# Altium footprint library Connector.PcbLib: 37 footprints (part 2 of 3)
Each footprint in its own frame and in the unit in brackets; x right, y up, seen from the top. Pads: shape width x height; smd on the part's side, far side on the other; paste and mask are expansions set on the pad; w line width, h text height; cw(c..) or ccw(c..) is an arc to the next point about the centre after c.
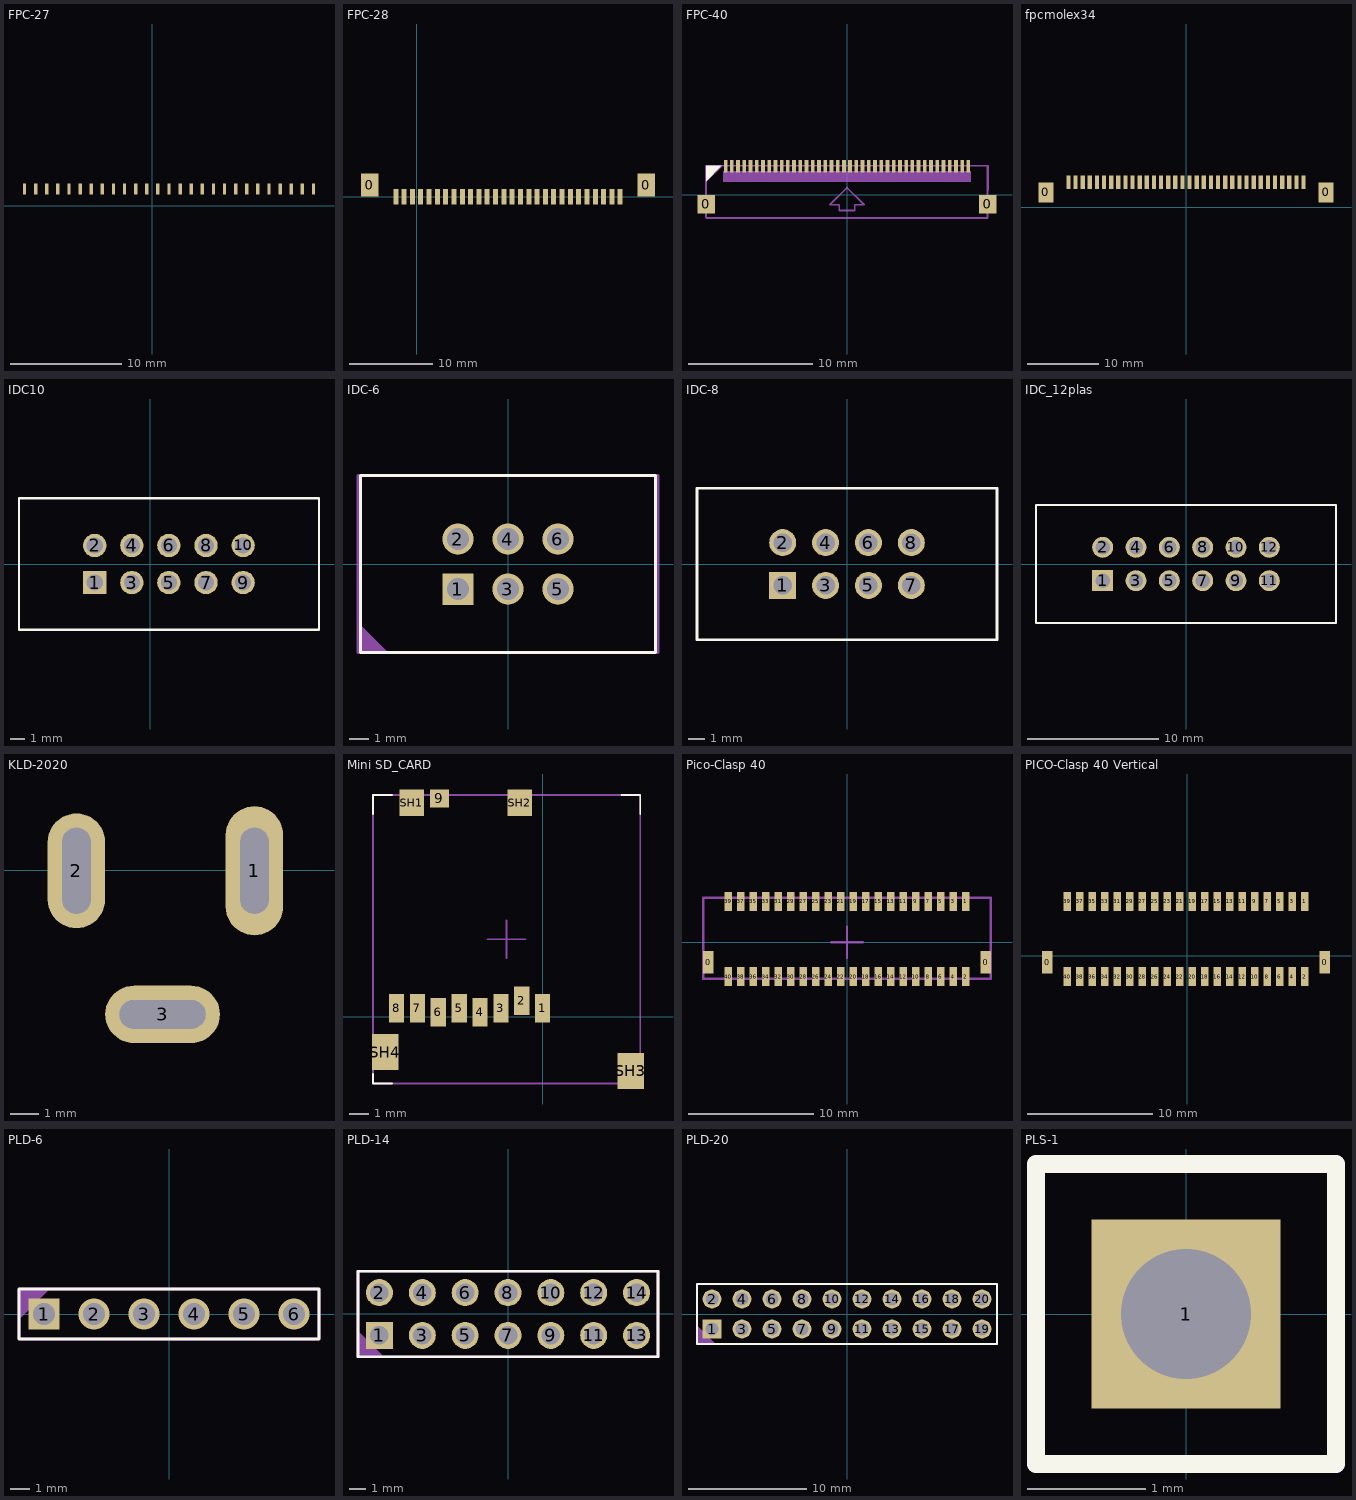
[diagram p1: the footprints below, top view; thin cyan lines are the x and y axes]

## FPC-27 [mm]
pads (27):
  rect 0.3x1 smd: 1(-11.5,1.5) 2(-10.5,1.5) 3(-9.5,1.5) 4(-8.5,1.5) 5(-7.5,1.5) 6(-6.5,1.5) 7(-5.5,1.5) 8(-4.5,1.5) 9(-3.5,1.5) 10(-2.5,1.5) 11(-1.5,1.5) 12(-0.5,1.5) 13(0.5,1.5) 14(1.5,1.5) 15(2.5,1.5) 16(3.5,1.5) 17(4.5,1.5) 18(5.5,1.5) 19(6.5,1.5) 20(7.5,1.5) 21(8.5,1.5) 22(9.5,1.5) 23(10.5,1.5) 24(11.5,1.5) 25(12.5,1.5) 26(13.5,1.5) 27(14.5,1.5)
3D body "522072760.stp": height 2.85, standoff 0.15, extent -15.15,-6.3 18.15,1.3

## FPC-28 [mm]
pads (30):
  rect 2.1x2.8 smd: 0(-5.65,1.4) 0(27.65,1.4)
  rect 0.6x1.9 smd: 1(-2.5,0) 2(-1.5,0) 3(-0.5,0) 4(0.5,0) 5(1.5,0) 6(2.5,0) 7(3.5,0) 8(4.5,0) 9(5.5,0) 10(6.5,0) 11(7.5,0) 12(8.5,0) 13(9.5,0) 14(10.5,0) 15(11.5,0) 16(12.5,0) 17(13.5,0) 18(14.5,0) 19(15.5,0) 20(16.5,0) 21(17.5,0) 22(18.5,0) 23(19.5,0) 24(20.5,0) 25(21.5,0) 26(22.5,0) 27(23.5,0) 28(24.5,0)
3D body "28.stp": height 3, standoff 0, extent -6.5,0 28.5,7.4

## FPC-40 [mm]
pads (42):
  rect 1.4x1.5 smd: 0(-11.3,-0.75) 0(11.3,-0.75)
  rect 0.3x1 smd: 1(-9.75,2.3) 2(-9.25,2.3) 3(-8.75,2.3) 4(-8.25,2.3) 5(-7.75,2.3) 6(-7.25,2.3) 7(-6.75,2.3) 8(-6.25,2.3) 9(-5.75,2.3) 10(-5.25,2.3) 11(-4.75,2.3) 12(-4.25,2.3) 13(-3.75,2.3) 14(-3.25,2.3) 15(-2.75,2.3) 16(-2.25,2.3) 17(-1.75,2.3) 18(-1.25,2.3) 19(-0.75,2.3) 20(-0.25,2.3) 21(0.25,2.3) 22(0.75,2.3) 23(1.25,2.3) 24(1.75,2.3) 25(2.25,2.3) 26(2.75,2.3) 27(3.25,2.3) 28(3.75,2.3) 29(4.25,2.3) 30(4.75,2.3) 31(5.25,2.3) 32(5.75,2.3) 33(6.25,2.3) 34(6.75,2.3) 35(7.25,2.3) 36(7.75,2.3) 37(8.25,2.3) 38(8.75,2.3) 39(9.25,2.3) 40(9.75,2.3)
Top Overlay:
  region: -11.325,1.1 -11.325,2.325 -10.1,2.325
Mechanical 29:
  region: 9.95,1.9 -9.975,1.9 -9.975,1.025 9.95,1.025
  region: -11.3,1.025 -11.275,1.05 -11.275,2.325 -10,2.325
  lines w0.15: -11.325,0.375 -11.325,2.325 ; -11.3,-1.875 -0.55,-1.875 11.3,-1.875 ; -10.2,2.325 -11.325,2.325 ; 10.2,2.325 11.325,2.325 11.325,0.375 ; -11.325,2.325 11.3,2.325 11.3,-1.85 -11.325,-1.85 -11.325,2.325 ; -1.375,-0.8 -0.625,-0.8 ; -1.375,-0.8 0,0.575 ; -1.375,-0.8 -0.625,-0.8 ; -1.375,-0.8 0,0.575 ; -0.625,-0.8 -0.625,-1.275 0.625,-1.275 0.625,-0.8 ; -0.625,-0.8 -0.625,-1.25 0.625,-1.25 0.625,-0.8 ; 0,0.575 1.375,-0.8 ; 0,0.575 1.375,-0.8 ; 0.625,-0.8 1.375,-0.8 ; 0.625,-0.8 1.375,-0.8
  text ".Designator" at -8.5,-0.675 h1
3D body "FPC-40.STEP": height 1.2, standoff -0.02, extent -11.025,-0.95 10.975,2.05

## fpcmolex34 [mm]
pads (36):
  rect 2.1x2.8 smd: 0(-19.65,2.1) 0(19.65,2.1)
  rect 0.6x1.9 smd: 1(-16.5,3.5) 2(-15.5,3.5) 3(-14.5,3.5) 4(-13.5,3.5) 5(-12.5,3.5) 6(-11.5,3.5) 7(-10.5,3.5) 8(-9.5,3.5) 9(-8.5,3.5) 10(-7.5,3.5) 11(-6.5,3.5) 12(-5.5,3.5) 13(-4.5,3.5) 14(-3.5,3.5) 15(-2.5,3.5) 16(-1.5,3.5) 17(-0.5,3.5) 18(0.5,3.5) 19(1.5,3.5) 20(2.5,3.5) 21(3.5,3.5) 22(4.5,3.5) 23(5.5,3.5) 24(6.5,3.5) 25(7.5,3.5) 26(8.5,3.5) 27(9.5,3.5) 28(10.5,3.5) 29(11.5,3.5) 30(12.5,3.5) 31(13.5,3.5) 32(14.5,3.5) 33(15.5,3.5) 34(16.5,3.5)
3D body "FPCright angle 34.stp": height 2.85, standoff 0.15, extent -20.15,-4.05 20.15,3.55

## IDC10 [mm]
pads (10):
  rect 1.6x1.6 hole 1.1: 1(-3.81,-1.27)
  round 1.6 hole 1.1: 2(-3.81,1.27) 3(-1.27,-1.27) 4(-1.27,1.27) 5(1.27,-1.27) 6(1.27,1.27) 7(3.81,-1.27) 8(3.81,1.27) 9(6.35,-1.27) 10(6.35,1.27)
Top Overlay:
  lines w0.15: -9,-4.5 11.55,-4.5 11.55,4.5 -9,4.5 -9,-4.5
3D body: height 9, standoff 0, extent -9,-4.5 11.55,4.5
3D body: height 3, standoff 0, extent -9,-4.5 11.55,4.5
3D body "PLS-1.STEP": height 8.5, standoff -3, extent 2.54,-2.54 5.08,0
3D body "PLS-1.STEP": height 8.5, standoff -3, extent 2.54,0 5.08,2.54
3D body "PLS-1.STEP": height 8.5, standoff -3, extent 0,-2.54 2.54,0
3D body "PLS-1.STEP": height 8.5, standoff -3, extent 0,0 2.54,2.54
3D body "PLS-1.STEP": height 8.5, standoff -3, extent -2.54,-2.54 0,0
3D body "PLS-1.STEP": height 8.5, standoff -3, extent -2.54,0 0,2.54
3D body "PLS-1.STEP": height 8.5, standoff -3, extent -5.08,0 -2.54,2.54
3D body "PLS-1.STEP": height 8.5, standoff -3, extent -5.08,-2.54 -2.54,0
3D body "PLS-1.STEP": height 8.5, standoff -3, extent 5.08,0 7.62,2.54
3D body "PLS-1.STEP": height 8.5, standoff -3, extent 5.08,-2.54 7.62,0

## IDC-6 [mm]
height 8
pads (6):
  rect 1.6x1.6 hole 1.1: 1(-2.54,-1.27)
  round 1.6 hole 1.1: 2(-2.54,1.27) 3(0,-1.27) 4(0,1.27) 5(2.54,-1.27) 6(2.54,1.27)
Top Overlay:
  lines w0.15: -7.5,-4.5 -7.5,4.5 7.5,4.5 7.5,-4.5 -7.5,-4.5
Mechanical 29:
  region: -7.62,-4.5 -7.62,-2.976 -6.096,-4.5
  lines w0.15: -7.62,-4.5 7.62,-4.5 7.62,4.5 -7.62,4.5 -7.62,-4.5
  text ".Designator" at -3.5,-0.3 h1
3D body "PLS-1.STEP": height 8.5, standoff -3, extent -3.81,-2.54 -1.27,0
3D body "PLS-1.STEP": height 8.5, standoff -3, extent -3.81,0 -1.27,2.54
3D body "PLS-1.STEP": height 8.5, standoff -3, extent -1.27,0 1.27,2.54
3D body "PLS-1.STEP": height 8.5, standoff -3, extent -1.27,-2.54 1.27,0
3D body "PLS-1.STEP": height 8.5, standoff -3, extent 1.27,0 3.81,2.54
3D body "PLS-1.STEP": height 8.5, standoff -3, extent 1.27,-2.54 3.81,0
3D body: height 9, standoff 0, extent -7.5,-4.5 7.5,4.5
3D body: height 3, standoff 0, extent -7.5,-4.5 7.5,4.5

## IDC-8 [mm]
pads (8):
  rect 1.6x1.6 hole 1.1: 1(-3.81,-1.27)
  round 1.6 hole 1.1: 2(-3.81,1.27) 3(-1.27,-1.27) 4(-1.27,1.27) 5(1.27,-1.27) 6(1.27,1.27) 7(3.81,-1.27) 8(3.81,1.27)
Top Overlay:
  lines w0.15: -8.89,-4.5 8.89,-4.5 8.89,4.5 -8.89,4.5 -8.89,-4.5
3D body: height 9, standoff 0, extent -9,-4.5 9,4.5
3D body: height 3, standoff 0, extent -9,-4.5 9,4.5
3D body "PLS-1.STEP": height 8.5, standoff -3, extent 2.54,-2.54 5.08,0
3D body "PLS-1.STEP": height 8.5, standoff -3, extent 2.54,0 5.08,2.54
3D body "PLS-1.STEP": height 8.5, standoff -3, extent 0,-2.54 2.54,0
3D body "PLS-1.STEP": height 8.5, standoff -3, extent 0,0 2.54,2.54
3D body "PLS-1.STEP": height 8.5, standoff -3, extent -2.54,-2.54 0,0
3D body "PLS-1.STEP": height 8.5, standoff -3, extent -2.54,0 0,2.54
3D body "PLS-1.STEP": height 8.5, standoff -3, extent -5.08,0 -2.54,2.54
3D body "PLS-1.STEP": height 8.5, standoff -3, extent -5.08,-2.54 -2.54,0

## IDC_12plas [mm]
pads (12):
  rect 1.6x1.6 hole 1.1: 1(-6.35,-1.27)
  round 1.6 hole 1.1: 2(-6.35,1.27) 3(-3.81,-1.27) 4(-3.81,1.27) 5(-1.27,-1.27) 6(-1.27,1.27) 7(1.27,-1.27) 8(1.27,1.27) 9(3.81,-1.27) 10(3.81,1.27) 11(6.35,-1.27) 12(6.35,1.27)
Top Overlay:
  lines w0.15: -11.43,-4.5 11.43,-4.5 11.43,4.5 -11.43,4.5 -11.43,-4.5
3D body "PLS-1.STEP": height 8.5, standoff -3, extent 5.08,-2.54 7.62,0
3D body "PLS-1.STEP": height 8.5, standoff -3, extent 5.08,0 7.62,2.54
3D body "PLS-1.STEP": height 8.5, standoff -3, extent 2.54,-2.54 5.08,0
3D body "PLS-1.STEP": height 8.5, standoff -3, extent 2.54,0 5.08,2.54
3D body "PLS-1.STEP": height 8.5, standoff -3, extent 0,-2.54 2.54,0
3D body "PLS-1.STEP": height 8.5, standoff -3, extent 0,0 2.54,2.54
3D body "PLS-1.STEP": height 8.5, standoff -3, extent -2.54,-2.54 0,0
3D body "PLS-1.STEP": height 8.5, standoff -3, extent -2.54,0 0,2.54
3D body "PLS-1.STEP": height 8.5, standoff -3, extent -5.08,-2.54 -2.54,0
3D body "PLS-1.STEP": height 8.5, standoff -3, extent -5.08,0 -2.54,2.54
3D body "PLS-1.STEP": height 8.5, standoff -3, extent -7.62,0 -5.08,2.54
3D body "PLS-1.STEP": height 8.5, standoff -3, extent -7.62,-2.54 -5.08,0
3D body: height 9, standoff 0, extent -11.5,-4.5 11.5,4.5
3D body: height 3, standoff 0, extent -11.5,-4.5 11.5,4.5

## KLD-2020 [mm]
pads (3):
  oval 2x4.5 hole 1 slot 3 at 90 deg: 1(13.475,-0.025)
  oval 2x4 hole 1 slot 3 at 90 deg: 2(7.275,-0.025)
  oval 4x2 hole 1 slot 3 at 0 deg: 3(10.275,-5.025)
3D body "User Library-KLD-0202-AC.step": height 12.1, standoff -2.6, extent -0.031,-4.95 14.6,4.45

## Mini SD_CARD [mm]
pads (13):
  rect 0.8x1.5 smd: 1(0,0.45) 2(-1.1,0.85) 3(-2.2,0.45) 4(-3.3,0.25) 5(-4.4,0.45) 6(-5.5,0.25) 7(-6.6,0.45) 8(-7.7,0.45)
  rect 1x0.95 smd: 9(-5.45,11.525)
  rect 1.3x1.4 smd: SH1(-6.9,11.3) SH2(-1.2,11.3)
  rect 1.4x1.9 smd: SH3(4.65,-2.85) SH4(-8.3,-1.85)
Top Overlay:
  lines w0.1: -8.95,-3 -8.95,-3.5 -7.95,-3.5 ; -8.95,10.7 -8.95,11.7 -7.95,11.7 ; 4.15,11.7 5.15,11.7 5.15,10.7
Mechanical 1:
  lines w0.1: -2.9,4.1 -0.9,4.1 ; -1.9,3.1 -1.9,5.1
Mechanical 32:
  lines w0.1: -8.95,-3.5 5.15,-3.5 5.15,11.7 -8.95,11.7 -8.95,-3.5
3D body "473521001.stp": height 1.95, standoff 0.07, extent -8.95,-3.5 5.15,11.7

## Pico-Clasp 40 [mm] "2035674007 Molex"
height 8.25
pads (42):
  rect 0.85x1.8 smd: 0(-11.1,-1.6) 0(11.1,-1.6)
  rect 0.6x1.5 smd: 1(9.5,3.25) 2(9.5,-2.75) 3(8.5,3.25) 4(8.5,-2.75) 5(7.5,3.25) 6(7.5,-2.75) 7(6.5,3.25) 8(6.5,-2.75) 9(5.5,3.25) 10(5.5,-2.75) 11(4.5,3.25) 12(4.5,-2.75) 13(3.5,3.25) 14(3.5,-2.75) 15(2.5,3.25) 16(2.5,-2.75) 17(1.5,3.25) 18(1.5,-2.75) 19(0.5,3.25) 20(0.5,-2.75) 21(-0.5,3.25) 22(-0.5,-2.75) 23(-1.5,3.25) 24(-1.5,-2.75) 25(-2.5,3.25) 26(-2.5,-2.75) 27(-3.5,3.25) 28(-3.5,-2.75) 29(-4.5,3.25) 30(-4.5,-2.75) 31(-5.5,3.25) 32(-5.5,-2.75) 33(-6.5,3.25) 34(-6.5,-2.75) 35(-7.5,3.25) 36(-7.5,-2.75) 37(-8.5,3.25) 38(-8.5,-2.75) 39(-9.5,3.25) 40(-9.5,-2.75)
Mechanical 32:
  lines w0.2: -1.25,0 0,0 ; 0,-1.25 0,0 ; 0,1.25 0,0 ; 1.25,0 0,0 ; -11.5,-2.95 -11.5,3.55 11.5,3.55 11.5,-2.95 -11.5,-2.95
3D body "2035674007(RA40).stp": height 8.28, standoff 0.03, extent -11.5,-2.95 11.5,3.55

## PICO-Clasp 40 Vertical [mm]
pads (42):
  rect 0.85x1.8 smd: 0(-11.2,-0.5) 0(11,-0.5)
  rect 0.6x1.5 smd: 1(9.4,4.35) 2(9.4,-1.65) 3(8.4,4.35) 4(8.4,-1.65) 5(7.4,4.35) 6(7.4,-1.65) 7(6.4,4.35) 8(6.4,-1.65) 9(5.4,4.35) 10(5.4,-1.65) 11(4.4,4.35) 12(4.4,-1.65) 13(3.4,4.35) 14(3.4,-1.65) 15(2.4,4.35) 16(2.4,-1.65) 17(1.4,4.35) 18(1.4,-1.65) 19(0.4,4.35) 20(0.4,-1.65) 21(-0.6,4.35) 22(-0.6,-1.65) 23(-1.6,4.35) 24(-1.6,-1.65) 25(-2.6,4.35) 26(-2.6,-1.65) 27(-3.6,4.35) 28(-3.6,-1.65) 29(-4.6,4.35) 30(-4.6,-1.65) 31(-5.6,4.35) 32(-5.6,-1.65) 33(-6.6,4.35) 34(-6.6,-1.65) 35(-7.6,4.35) 36(-7.6,-1.65) 37(-8.6,4.35) 38(-8.6,-1.65) 39(-9.6,4.35) 40(-9.6,-1.65)
3D body "2035644017.stp": height 5.63, standoff 0.05, extent -11.25,-2.2 11.05,5.07

## PLD-6 [mm]
pads (6):
  rect 1.6x1.6 hole 1.1: 1(-6.35,0)
  round 1.6 hole 1.1: 2(-3.81,0) 3(-1.27,0) 4(1.27,0) 5(3.81,0) 6(6.35,0)
Top Overlay:
  lines w0.15: -7.62,-1.27 -7.62,1.27 7.62,1.27 7.62,-1.27 -7.62,-1.27
Mechanical 29:
  region: -7.62,1.27 -6.096,1.27 -7.62,-0.254
  lines w0.15: -7.62,-1.27 7.62,-1.27 7.62,1.27 -7.62,1.27 -7.62,-1.27
  text ".Designator" at -3.5,-0.3 h1
3D body "PLS-1.STEP": height 8.5, standoff -3, extent -7.62,-1.27 -5.08,1.27
3D body "PLS-1.STEP": height 8.5, standoff -3, extent -5.08,-1.27 -2.54,1.27
3D body "PLS-1.STEP": height 8.5, standoff -3, extent -2.54,-1.27 0,1.27
3D body "PLS-1.STEP": height 8.5, standoff -3, extent 0,-1.27 2.54,1.27
3D body "PLS-1.STEP": height 8.5, standoff -3, extent 2.54,-1.27 5.08,1.27
3D body "PLS-1.STEP": height 8.5, standoff -3, extent 5.08,-1.27 7.62,1.27

## PLD-14 [mm]
height 8
pads (14):
  rect 1.6x1.6 hole 1.1: 1(-7.62,-1.27)
  round 1.6 hole 1.1: 2(-7.62,1.27) 3(-5.08,-1.27) 4(-5.08,1.27) 5(-2.54,-1.27) 6(-2.54,1.27) 7(0,-1.27) 8(0,1.27) 9(2.54,-1.27) 10(2.54,1.27) 11(5.08,-1.27) 12(5.08,1.27) 13(7.62,-1.27) 14(7.62,1.27)
Top Overlay:
  lines w0.15: -8.89,-2.54 -8.89,2.54 8.89,2.54 8.89,-2.54 -8.89,-2.54
Mechanical 29:
  region: -8.89,-2.54 -8.89,-1.016 -7.366,-2.54
  lines w0.15: -8.89,-2.54 8.89,-2.54 8.89,2.54 -8.89,2.54 -8.89,-2.54
  text ".Designator" at -3.5,-0.3 h1
3D body "PLS-1.STEP": height 8.5, standoff -3, extent -8.89,-2.54 -6.35,0
3D body "PLS-1.STEP": height 8.5, standoff -3, extent -8.89,0 -6.35,2.54
3D body "PLS-1.STEP": height 8.5, standoff -3, extent -6.35,0 -3.81,2.54
3D body "PLS-1.STEP": height 8.5, standoff -3, extent -6.35,-2.54 -3.81,0
3D body "PLS-1.STEP": height 8.5, standoff -3, extent -3.81,0 -1.27,2.54
3D body "PLS-1.STEP": height 8.5, standoff -3, extent -3.81,-2.54 -1.27,0
3D body "PLS-1.STEP": height 8.5, standoff -3, extent -1.27,0 1.27,2.54
3D body "PLS-1.STEP": height 8.5, standoff -3, extent -1.27,-2.54 1.27,0
3D body "PLS-1.STEP": height 8.5, standoff -3, extent 1.27,0 3.81,2.54
3D body "PLS-1.STEP": height 8.5, standoff -3, extent 1.27,-2.54 3.81,0
3D body "PLS-1.STEP": height 8.5, standoff -3, extent 3.81,0 6.35,2.54
3D body "PLS-1.STEP": height 8.5, standoff -3, extent 3.81,-2.54 6.35,0
3D body "PLS-1.STEP": height 8.5, standoff -3, extent 6.35,0 8.89,2.54
3D body "PLS-1.STEP": height 8.5, standoff -3, extent 6.35,-2.54 8.89,0

## PLD-20 [mm]
height 8
pads (20):
  rect 1.6x1.6 hole 1.1: 1(-11.43,-1.27)
  round 1.6 hole 1.1: 2(-11.43,1.27) 3(-8.89,-1.27) 4(-8.89,1.27) 5(-6.35,-1.27) 6(-6.35,1.27) 7(-3.81,-1.27) 8(-3.81,1.27) 9(-1.27,-1.27) 10(-1.27,1.27) 11(1.27,-1.27) 12(1.27,1.27) 13(3.81,-1.27) 14(3.81,1.27) 15(6.35,-1.27) 16(6.35,1.27) 17(8.89,-1.27) 18(8.89,1.27) 19(11.43,-1.27) 20(11.43,1.27)
Top Overlay:
  lines w0.15: -12.7,-2.54 -12.7,2.54 12.7,2.54 12.7,-2.54 -12.7,-2.54
Mechanical 29:
  region: -12.7,-2.54 -12.7,-1.016 -11.176,-2.54
  lines w0.15: -12.7,-2.54 12.7,-2.54 12.7,2.54 -12.7,2.54 -12.7,-2.54
  text ".Designator" at -4,-0.3 h1
3D body "PLS-1.STEP": height 8.5, standoff -3, extent -12.7,-2.54 -10.16,0
3D body "PLS-1.STEP": height 8.5, standoff -3, extent -12.7,0 -10.16,2.54
3D body "PLS-1.STEP": height 8.5, standoff -3, extent -10.16,0 -7.62,2.54
3D body "PLS-1.STEP": height 8.5, standoff -3, extent -10.16,-2.54 -7.62,0
3D body "PLS-1.STEP": height 8.5, standoff -3, extent -7.62,0 -5.08,2.54
3D body "PLS-1.STEP": height 8.5, standoff -3, extent -7.62,-2.54 -5.08,0
3D body "PLS-1.STEP": height 8.5, standoff -3, extent -5.08,0 -2.54,2.54
3D body "PLS-1.STEP": height 8.5, standoff -3, extent -5.08,-2.54 -2.54,0
3D body "PLS-1.STEP": height 8.5, standoff -3, extent -2.54,0 0,2.54
3D body "PLS-1.STEP": height 8.5, standoff -3, extent -2.54,-2.54 0,0
3D body "PLS-1.STEP": height 8.5, standoff -3, extent 0,0 2.54,2.54
3D body "PLS-1.STEP": height 8.5, standoff -3, extent 0,-2.54 2.54,0
3D body "PLS-1.STEP": height 8.5, standoff -3, extent 2.54,0 5.08,2.54
3D body "PLS-1.STEP": height 8.5, standoff -3, extent 5.08,0 7.62,2.54
3D body "PLS-1.STEP": height 8.5, standoff -3, extent 7.62,0 10.16,2.54
3D body "PLS-1.STEP": height 8.5, standoff -3, extent 10.16,0 12.7,2.54
3D body "PLS-1.STEP": height 8.5, standoff -3, extent 10.16,-2.54 12.7,0
3D body "PLS-1.STEP": height 8.5, standoff -3, extent 7.62,-2.54 10.16,0
3D body "PLS-1.STEP": height 8.5, standoff -3, extent 5.08,-2.54 7.62,0
3D body "PLS-1.STEP": height 8.5, standoff -3, extent 2.54,-2.54 5.08,0

## PLS-1 [mm]
pads (1):
  rect 1.6x1.6 hole 1.1: 1(0,0)
Top Overlay:
  lines w0.15: -1.27,-1.27 -1.27,1.27 1.27,1.27 1.27,-1.27 -1.27,-1.27
Mechanical 29:
  lines w0.15: -1.27,-1.27 1.27,-1.27 1.27,1.27 -1.27,1.27 -1.27,-1.27
  text ".Designator" at -1.5,1.7 h1
3D body "PLS-1.STEP": height 8.5, standoff -3, extent -1.27,-1.27 1.27,1.27